# Altium footprint library myPcbLib.PcbLib: 987 footprints (part 9 of 62)
Each footprint in its own frame and in the unit in brackets; x right, y up, seen from the top. Pads: shape width x height; smd on the part's side, far side on the other; paste and mask are expansions set on the pad; w line width, h text height; cw(c..) or ccw(c..) is an arc to the next point about the centre after c.
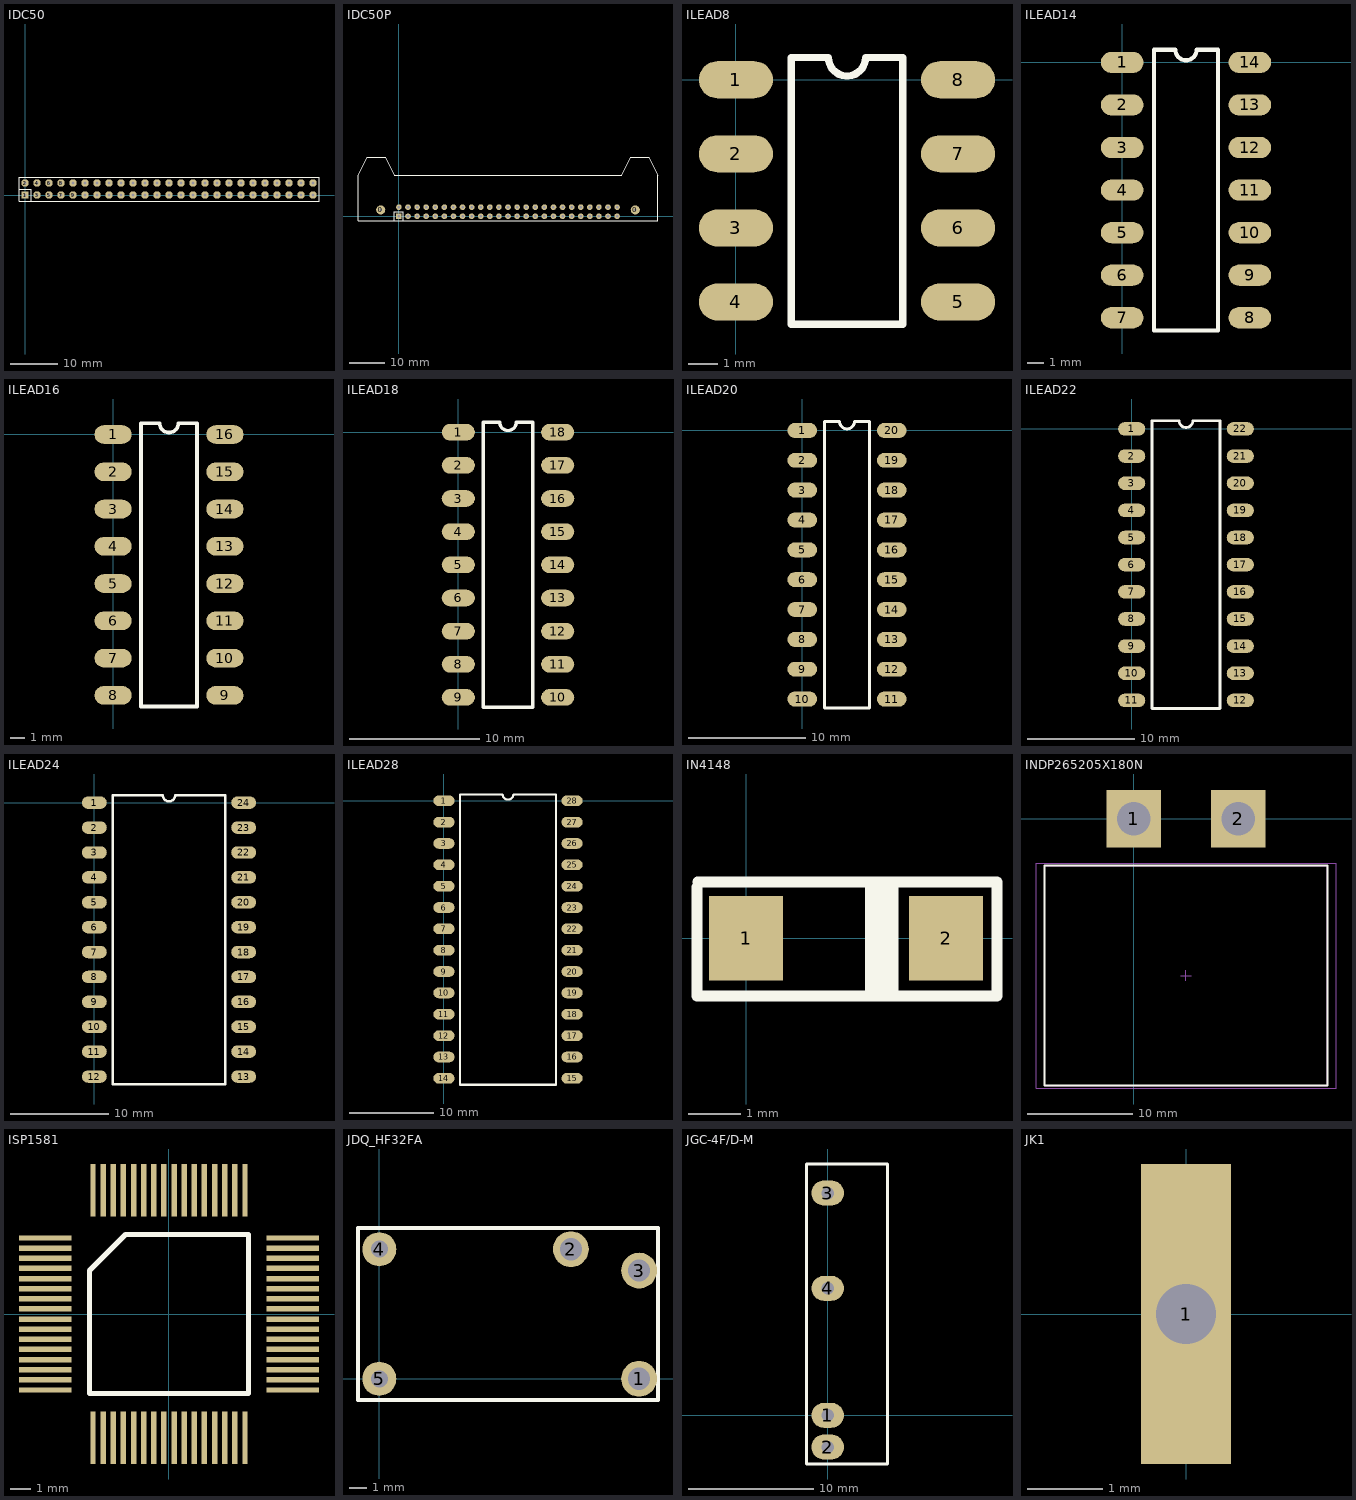
[diagram p8: the footprints below, top view; thin cyan lines are the x and y axes]

## IDC50 [mil]
pads (50):
  rect 62x62 hole 28: 1(0,0)
  round 62 hole 28: 2(0,100) 3(100,0) 4(100,100) 5(200,0) 6(200,100) 7(300,0) 8(300,100) 9(400,0) 10(400,100) 11(500,0) 12(500,100) 13(600,0) 14(600,100) 15(700,0) 16(700,100) 17(800,0) 18(800,100) 19(900,0) 20(900,100) 21(1000,0) 22(1000,100) 23(1100,0) 24(1100,100) 25(1200,0) 26(1200,100) 27(1300,0) 28(1300,100) 29(1400,0) 30(1400,100) 31(1500,0) 32(1500,100) 33(1600,0) 34(1600,100) 35(1700,0) 36(1700,100) 37(1800,0) 38(1800,100) 39(1900,0) 40(1900,100) 41(2000,0) 42(2000,100) 43(2100,0) 44(2100,100) 45(2200,0) 46(2200,100) 47(2300,0) 48(2300,100) 49(2400,0) 50(2400,100)
Top Overlay:
  lines w10: -50,50 50,50 50,-50 ; -50,-50 2450,-50 2450,150 -50,150 -50,-50

## IDC50P [mil]
pads (52):
  round 100 hole 28: 0(-200,70) 0(2600,70)
  rect 62x62 hole 28: 1(0,0)
  round 62 hole 28: 2(0,100) 3(100,0) 4(100,100) 5(200,0) 6(200,100) 7(300,0) 8(300,100) 9(400,0) 10(400,100) 11(500,0) 12(500,100) 13(600,0) 14(600,100) 15(700,0) 16(700,100) 17(800,0) 18(800,100) 19(900,0) 20(900,100) 21(1000,0) 22(1000,100) 23(1100,0) 24(1100,100) 25(1200,0) 26(1200,100) 27(1300,0) 28(1300,100) 29(1400,0) 30(1400,100) 31(1500,0) 32(1500,100) 33(1600,0) 34(1600,100) 35(1700,0) 36(1700,100) 37(1800,0) 38(1800,100) 39(1900,0) 40(1900,100) 41(2000,0) 42(2000,100) 43(2100,0) 44(2100,100) 45(2200,0) 46(2200,100) 47(2300,0) 48(2300,100) 49(2400,0) 50(2400,100)
Top Overlay:
  lines w10: -50,-50 -50,50 50,50 50,-50 ; -450,-50 2850,-50 2850,450 2750,650 2550,650 2450,450 -50,450 -150,650 -350,650 -450,450 -450,-50

## ILEAD8 [mm]
pads (8):
  oval 2.54x1.27 smd: 1(0,0) 2(0,-2.54) 3(0,-5.08) 4(0,-7.62) 5(7.62,-7.62) 6(7.62,-5.08) 7(7.62,-2.54) 8(7.62,0)
Top Overlay:
  lines w0.254: 1.905,-8.382 5.715,-8.382 5.715,0.762 4.445,0.762 cw(c3.81,0.762) 3.175,0.762 1.905,0.762 1.905,-8.382

## ILEAD14 [mm]
pads (14):
  oval 2.54x1.27 smd: 1(0,0) 2(0,-2.54) 3(0,-5.08) 4(0,-7.62) 5(0,-10.16) 6(0,-12.7) 7(0,-15.24) 8(7.62,-15.24) 9(7.62,-12.7) 10(7.62,-10.16) 11(7.62,-7.62) 12(7.62,-5.08) 13(7.62,-2.54) 14(7.62,0)
Top Overlay:
  lines w0.254: 1.905,-16.002 1.905,0.762 3.175,0.762 ccw(c3.81,0.762) 4.445,0.762 5.715,0.762 5.715,-16.002 1.905,-16.002

## ILEAD16 [mm]
pads (16):
  oval 2.54x1.27 smd: 1(0,0) 2(0,-2.54) 3(0,-5.08) 4(0,-7.62) 5(0,-10.16) 6(0,-12.7) 7(0,-15.24) 8(0,-17.78) 9(7.62,-17.78) 10(7.62,-15.24) 11(7.62,-12.7) 12(7.62,-10.16) 13(7.62,-7.62) 14(7.62,-5.08) 15(7.62,-2.54) 16(7.62,0)
Top Overlay:
  lines w0.254: 1.905,-18.542 1.905,0.762 3.175,0.762 ccw(c3.81,0.762) 4.445,0.762 5.715,0.762 5.715,-18.542 1.905,-18.542

## ILEAD18 [mm]
pads (18):
  oval 2.54x1.27 smd: 1(0,0) 2(0,-2.54) 3(0,-5.08) 4(0,-7.62) 5(0,-10.16) 6(0,-12.7) 7(0,-15.24) 8(0,-17.78) 9(0,-20.32) 10(7.62,-20.32) 11(7.62,-17.78) 12(7.62,-15.24) 13(7.62,-12.7) 14(7.62,-10.16) 15(7.62,-7.62) 16(7.62,-5.08) 17(7.62,-2.54) 18(7.62,0)
Top Overlay:
  lines w0.254: 1.905,-21.082 1.905,0.762 3.175,0.762 ccw(c3.81,0.762) 4.445,0.762 5.715,0.762 5.715,-21.082 1.905,-21.082

## ILEAD20 [mm]
pads (20):
  oval 2.54x1.27 smd: 1(0,0) 2(0,-2.54) 3(0,-5.08) 4(0,-7.62) 5(0,-10.16) 6(0,-12.7) 7(0,-15.24) 8(0,-17.78) 9(0,-20.32) 10(0,-22.86) 11(7.62,-22.86) 12(7.62,-20.32) 13(7.62,-17.78) 14(7.62,-15.24) 15(7.62,-12.7) 16(7.62,-10.16) 17(7.62,-7.62) 18(7.62,-5.08) 19(7.62,-2.54) 20(7.62,0)
Top Overlay:
  lines w0.254: 1.905,-23.622 5.715,-23.622 5.715,0.762 4.445,0.762 cw(c3.81,0.762) 3.175,0.762 1.905,0.762 1.905,-23.622

## ILEAD22 [mm]
pads (22):
  oval 2.54x1.27 smd: 1(0,0) 2(0,-2.54) 3(0,-5.08) 4(0,-7.62) 5(0,-10.16) 6(0,-12.7) 7(0,-15.24) 8(0,-17.78) 9(0,-20.32) 10(0,-22.86) 11(0,-25.4) 12(10.16,-25.4) 13(10.16,-22.86) 14(10.16,-20.32) 15(10.16,-17.78) 16(10.16,-15.24) 17(10.16,-12.7) 18(10.16,-10.16) 19(10.16,-7.62) 20(10.16,-5.08) 21(10.16,-2.54) 22(10.16,0)
Top Overlay:
  lines w0.254: 1.905,-26.162 1.905,0.762 4.445,0.762 ccw(c5.08,0.762) 5.715,0.762 8.255,0.762 8.255,-26.162 1.905,-26.162

## ILEAD24 [mm]
pads (24):
  oval 2.54x1.27 smd: 1(0,0) 2(0,-2.54) 3(0,-5.08) 4(0,-7.62) 5(0,-10.16) 6(0,-12.7) 7(0,-15.24) 8(0,-17.78) 9(0,-20.32) 10(0,-22.86) 11(0,-25.4) 12(0,-27.94) 13(15.24,-27.94) 14(15.24,-25.4) 15(15.24,-22.86) 16(15.24,-20.32) 17(15.24,-17.78) 18(15.24,-15.24) 19(15.24,-12.7) 20(15.24,-10.16) 21(15.24,-7.62) 22(15.24,-5.08) 23(15.24,-2.54) 24(15.24,0)
Top Overlay:
  lines w0.254: 1.905,-28.702 1.905,0.762 6.985,0.762 ccw(c7.62,0.762) 8.255,0.762 13.335,0.762 13.335,-28.702 1.905,-28.702

## ILEAD28 [mm]
pads (28):
  oval 2.54x1.27 smd: 1(0,0) 2(0,-2.54) 3(0,-5.08) 4(0,-7.62) 5(0,-10.16) 6(0,-12.7) 7(0,-15.24) 8(0,-17.78) 9(0,-20.32) 10(0,-22.86) 11(0,-25.4) 12(0,-27.94) 13(0,-30.48) 14(0,-33.02) 15(15.24,-33.02) 16(15.24,-30.48) 17(15.24,-27.94) 18(15.24,-25.4) 19(15.24,-22.86) 20(15.24,-20.32) 21(15.24,-17.78) 22(15.24,-15.24) 23(15.24,-12.7) 24(15.24,-10.16) 25(15.24,-7.62) 26(15.24,-5.08) 27(15.24,-2.54) 28(15.24,0)
Top Overlay:
  lines w0.254: 1.905,-33.782 1.905,0.762 6.985,0.762 ccw(c7.62,0.762) 8.255,0.762 13.335,0.762 13.335,-33.782 1.905,-33.782

## IN4148 [mm]
pads (2):
  rect 1.4x1.6 smd: 1(0,0) 2(3.789,0)
Top Overlay:
  region: 2.883,1.069 2.248,1.069 2.248,-1.09 2.883,-1.09
  lines w0.2: -0.931,0.974 -0.931,-1.09 4.752,-1.09 4.752,1.069 -0.921,1.069

## INDP265205X180N [mm] "Precision Wire Wound Inductor, 2-Leads, Body 26.5x20.5mm, IPC Medium Density"
height 18
pads (2):
  rect 5.2x5.5 hole 3.2: 1(0,0) 2(10,0)
Top Overlay:
  lines w0.2: -8.504,-18.44 -8.504,-4.486 18.496,-4.486 18.496,-17.882 ; -8.504,-17.486 -8.504,-25.486 18.496,-25.486 18.496,-17.486
Mechanical 13:
  lines w0.1: -8.504,-25.486 -8.504,-4.486 18.496,-4.486 18.496,-25.486 -8.504,-25.486
Mechanical 15:
  lines w0.1: 4.496,-14.986 5.496,-14.986 ; 4.996,-15.486 4.996,-14.486 ; -9.329,-25.736 -9.329,-4.236 19.321,-4.236 19.321,-25.736 -9.329,-25.736
3D body: height 18, standoff 0, extent -8.504,-25.486 18.496,-4.486

## ISP1581 [mm]
height 2
pads (64):
  rect 2.6x0.27 smd: 1(-6.1,3.75) 2(-6.1,3.25) 3(-6.1,2.75) 4(-6.1,2.25) 5(-6.1,1.75) 6(-6.1,1.25) 7(-6.1,0.75) 8(-6.1,0.25) 9(-6.1,-0.25) 10(-6.1,-0.75) 11(-6.1,-1.25) 12(-6.1,-1.75) 13(-6.1,-2.25) 14(-6.1,-2.75) 15(-6.1,-3.25) 16(-6.1,-3.75) 33(6.1,-3.75) 34(6.1,-3.25) 35(6.1,-2.75) 36(6.1,-2.25) 37(6.1,-1.75) 38(6.1,-1.25) 39(6.1,-0.75) 40(6.1,-0.25) 41(6.1,0.25) 42(6.1,0.75) 43(6.1,1.25) 44(6.1,1.75) 45(6.1,2.25) 46(6.1,2.75) 47(6.1,3.25) 48(6.1,3.75)
  rect 0.27x2.6 smd: 17(-3.75,-6.1) 18(-3.25,-6.1) 19(-2.75,-6.1) 20(-2.25,-6.1) 21(-1.75,-6.1) 22(-1.25,-6.1) 23(-0.75,-6.1) 24(-0.25,-6.1) 25(0.25,-6.1) 26(0.75,-6.1) 27(1.25,-6.1) 28(1.75,-6.1) 29(2.25,-6.1) 30(2.75,-6.1) 31(3.25,-6.1) 32(3.75,-6.1) 49(3.75,6.1) 50(3.25,6.1) 51(2.75,6.1) 52(2.25,6.1) 53(1.75,6.1) 54(1.25,6.1) 55(0.75,6.1) 56(0.25,6.1) 57(-0.25,6.1) 58(-0.75,6.1) 59(-1.25,6.1) 60(-1.75,6.1) 61(-2.25,6.1) 62(-2.75,6.1) 63(-3.25,6.1) 64(-3.75,6.1)
Top Overlay:
  lines w0.254: -3.927,-3.928 3.928,-3.928 3.928,3.928 -2.142,3.928 -3.927,2.142 -3.927,-3.928

## JDQ_HF32FA [mm]
pads (5):
  round 2.1 hole 1.3: 1(15.24,0) 2(11.24,7.6) 3(15.24,6.35)
  round 2 hole 1: 4(0,7.6) 5(0,0)
Top Overlay:
  lines w0.254: -1.25,-1.25 -1.25,8.85 16.35,8.85 16.35,-1.25 -1.25,-1.25

## JGC-4F/D-M [mm]
pads (4):
  oval 2.6x2 hole 1: 1(0,-0.025) 2(0,-2.565) 3(0,17.755) 4(0,10.135)
Top Overlay:
  lines w0.254: -1.7,-3.919 4.8,-3.919 4.8,20.081 -1.7,20.081 -1.7,-3.919

## JK1 [mm]
pads (1):
  rect 1.2x4 hole 0.8: 1(0,0)